# Altium footprint library PR_COR.PcbLib: 73 footprints (part 1 of 5)
Each footprint in its own frame and in the unit in brackets; x right, y up, seen from the top. Pads: shape width x height; smd on the part's side, far side on the other; paste and mask are expansions set on the pad; w line width, h text height; cw(c..) or ccw(c..) is an arc to the next point about the centre after c.
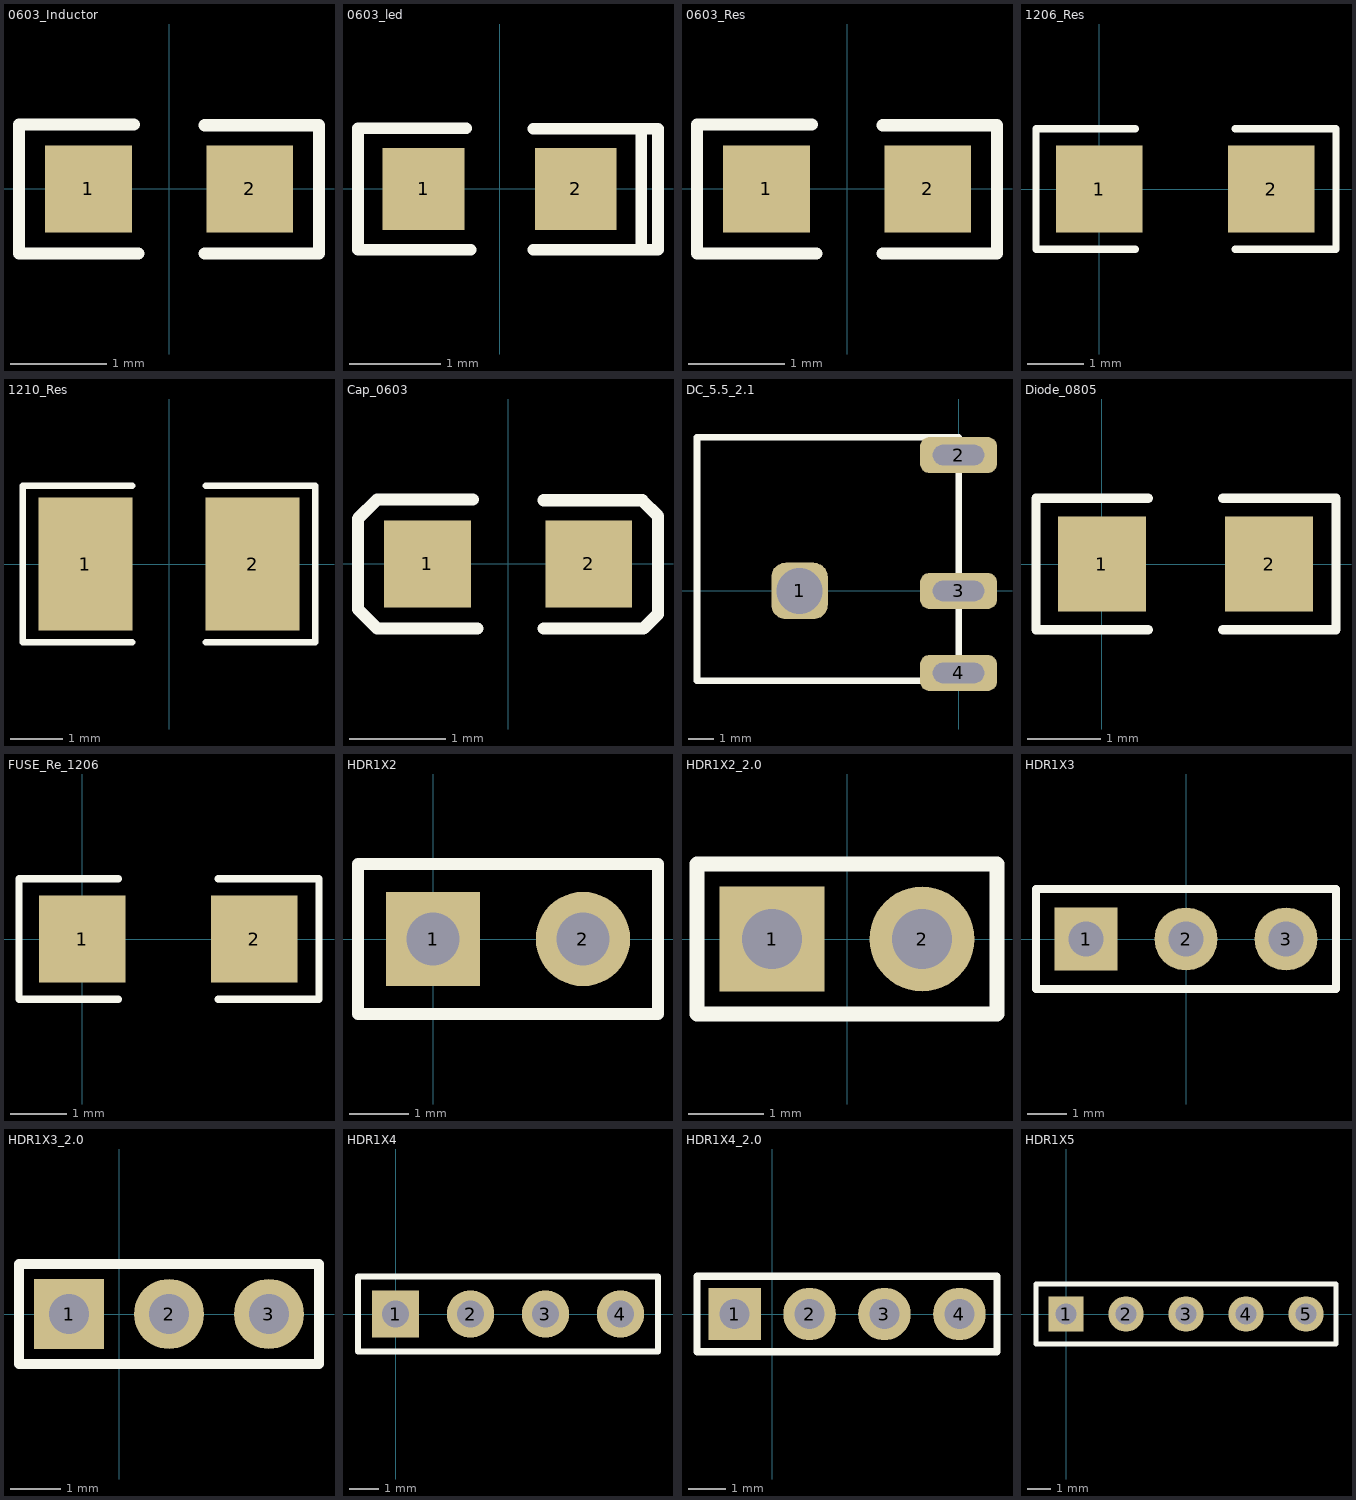
[diagram p0: the footprints below, top view; thin cyan lines are the x and y axes]

## 0603_Inductor [mm]
height 1
pads (2):
  rect 0.9x0.9 smd: 1(-0.836,0) 2(0.836,0)
Top Overlay:
  lines w0.127: -0.366,0.668 -1.556,0.668 -1.556,-0.67 -0.316,-0.67 ; 0.37,-0.67 1.554,-0.67 1.554,0.66 0.37,0.66
3D body: height 0.39, standoff 0.02, extent -0.81,-0.4 0.81,0.4

## 0603_led [mm]
height 1
pads (2):
  rect 0.9x0.9 smd: 1(-0.836,0) 2(0.836,0)
Top Overlay:
  lines w0.127: -0.366,0.668 -1.556,0.668 -1.556,-0.67 -0.316,-0.67 ; 0.37,-0.67 1.739,-0.67 1.739,0.66 0.37,0.66 ; 1.554,-0.67 1.554,0.66
3D body: height 0.39, standoff 0.02, extent -0.81,-0.4 0.81,0.4

## 0603_Res [mm]
height 1
pads (2):
  rect 0.9x0.9 smd: 1(-0.836,0) 2(0.836,0)
Top Overlay:
  lines w0.127: -0.366,0.668 -1.556,0.668 -1.556,-0.67 -0.316,-0.67 ; 0.37,-0.67 1.554,-0.67 1.554,0.66 0.37,0.66
3D body: height 0.39, standoff 0.02, extent -0.81,-0.4 0.81,0.4

## 1206_Res [mil] "自恢复保险丝1206封装"
pads (2):
  rect 60x60 smd: 1(0,0) 2(119.25,0)
Top Overlay:
  lines w5: 25,-41.73 -43.7,-41.73 -43.7,41.73 25,41.73 ; 94.25,-41.73 164.17,-41.73 164.17,41.73 94.25,41.73
3D body: height 22.65, standoff 2.18, extent -4.32,-31.5 122.45,31.5

## 1210_Res [mm] "自恢复保险丝1206封装"
pads (2):
  rect 1.8x2.54 smd: 1(-1.6,0) 2(1.6,0)
Top Overlay:
  lines w0.127: -0.7,-1.5 -2.8,-1.5 -2.8,1.5 -0.7,1.5 ; 0.7,-1.5 2.8,-1.5 2.8,1.5 0.7,1.5
3D body: height 0.58, standoff 0.06, extent -1.624,-1.27 1.596,1.27

## Cap_0603 [mm]
height 1
pads (2):
  rect 0.9x0.9 smd: 1(-0.836,0) 2(0.836,0)
Top Overlay:
  lines w0.127: -0.366,0.668 -1.357,0.668 -1.556,0.469 -1.556,-0.469 -1.355,-0.67 -0.316,-0.67 ; 0.37,-0.67 1.405,-0.67 1.554,-0.521 1.554,0.496 1.39,0.66 0.37,0.66
3D body: height 0.56, standoff 0.02, extent -0.835,-0.415 0.835,0.425

## DC_5.5_2.1 [mm]
pads (4):
  rrect50% 2.2x2.2 hole 1.8 square: 1(-6.2,0)
  rrect50% 3x1.4 hole 0.8 slot 2 at 0 deg: 2(0,5.3) 3(0,0) 4(0,-3.2)
Top Overlay:
  lines w0.254: -10.2,-3.5 0,-3.5 0,6 -10.2,6 -10.2,-3.5
3D body: height 7.02, standoff -2.68, extent -10.2,-3.5 1.4,6

## Diode_0805 [mm]
height 1
pads (2):
  rect 1.2x1.3 smd: 1(0,0) 2(2.286,0)
Top Overlay:
  lines w0.127: 0.635,-0.9 -0.9,-0.9 -0.9,0.9 0.635,0.9 ; 1.651,-0.9 3.2,-0.9 3.2,0.9 1.651,0.9
3D body: height 0.55, standoff 0, extent 0.15,-0.63 2.15,0.63

## FUSE_Re_1206 [mil] "自恢复保险丝1206封装"
pads (2):
  rect 60x60 smd: 1(0,0) 2(119.25,0)
Top Overlay:
  lines w5: 25,-41.73 -43.7,-41.73 -43.7,41.73 25,41.73 ; 94.25,-41.73 164.17,-41.73 164.17,41.73 94.25,41.73
3D body: height 24.22, standoff 0.6, extent -4.33,-31.5 122.45,31.5

## HDR1X2 [mm] "Connector; Header; 2 Position"
pads (2):
  rect 1.6x1.6 hole 0.9: 1(0,0)
  round 1.6 hole 0.9: 2(2.54,0)
Top Overlay:
  lines w0.2: -1.27,-1.27 -1.27,1.27 3.81,1.27 3.81,-1.27 -1.27,-1.27
3D body: height 8.02, standoff -2.98, extent -1.27,-1.27 3.81,1.27

## HDR1X2_2.0 [mm] "Connector; Header; 2 Position"
pads (2):
  rect 1.4x1.4 hole 0.8: 1(-1,0)
  round 1.4 hole 0.8: 2(1,0)
Top Overlay:
  lines w0.2: -2,-1 2,-1 2,1 -2,1 -2,-1
3D body: height 5.82, standoff -2.78, extent -2,-1 2,1

## HDR1X3 [mm] "Connector; Header; 3 Position"
pads (3):
  rect 1.6x1.6 hole 0.9: 1(-2.54,0)
  round 1.6 hole 0.9: 2(0,0) 3(2.54,0)
Top Overlay:
  lines w0.2: -3.81,-1.27 -3.81,1.27 3.81,1.27 3.81,-1.27 -3.81,-1.27
3D body: height 8.02, standoff -2.98, extent -3.81,-1.27 3.81,1.27

## HDR1X3_2.0 [mm] "Connector; Header; 2 Position"
pads (3):
  rect 1.4x1.4 hole 0.8: 1(-1,0)
  round 1.4 hole 0.8: 2(1,0) 3(3,0)
Top Overlay:
  lines w0.2: -2,-1 -2,1 4,1 4,-1 -2,-1
3D body: height 5.82, standoff -2.78, extent -2,-1 4,1

## HDR1X4 [mm] "Connector; Header; 4 Position"
pads (4):
  rect 1.6x1.6 hole 0.9: 1(0,0)
  round 1.6 hole 0.9: 2(2.54,0) 3(5.08,0) 4(7.62,0)
Top Overlay:
  lines w0.2: -1.27,-1.27 -1.27,1.27 8.89,1.27 8.89,-1.27 -1.27,-1.27
3D body: height 8.02, standoff -2.98, extent -1.27,-1.27 8.89,1.27

## HDR1X4_2.0 [mm] "Connector; Header; 2 Position"
pads (4):
  rect 1.4x1.4 hole 0.8: 1(-1,0)
  round 1.4 hole 0.8: 2(1,0) 3(3,0) 4(5,0)
Top Overlay:
  lines w0.2: -2,-1 6,-1 6,1 -2,1 -2,-1
3D body: height 5.82, standoff -2.78, extent -2,-1 6,1

## HDR1X5 [mm] "Connector; Header; 5 Position"
pads (5):
  rect 1.5x1.5 hole 0.9: 1(0,0)
  round 1.5 hole 0.9: 2(2.54,0) 3(5.08,0) 4(7.62,0) 5(10.16,0)
Top Overlay:
  lines w0.2: -1.27,-1.27 11.43,-1.27 11.43,1.27 -1.27,1.27 -1.27,-1.27